# Altium footprint library Chestin_PcbLib.PcbLib: 203 footprints (part 9 of 13)
Each footprint in its own frame and in the unit in brackets; x right, y up, seen from the top. Pads: shape width x height; smd on the part's side, far side on the other; paste and mask are expansions set on the pad; w line width, h text height; cw(c..) or ccw(c..) is an arc to the next point about the centre after c.
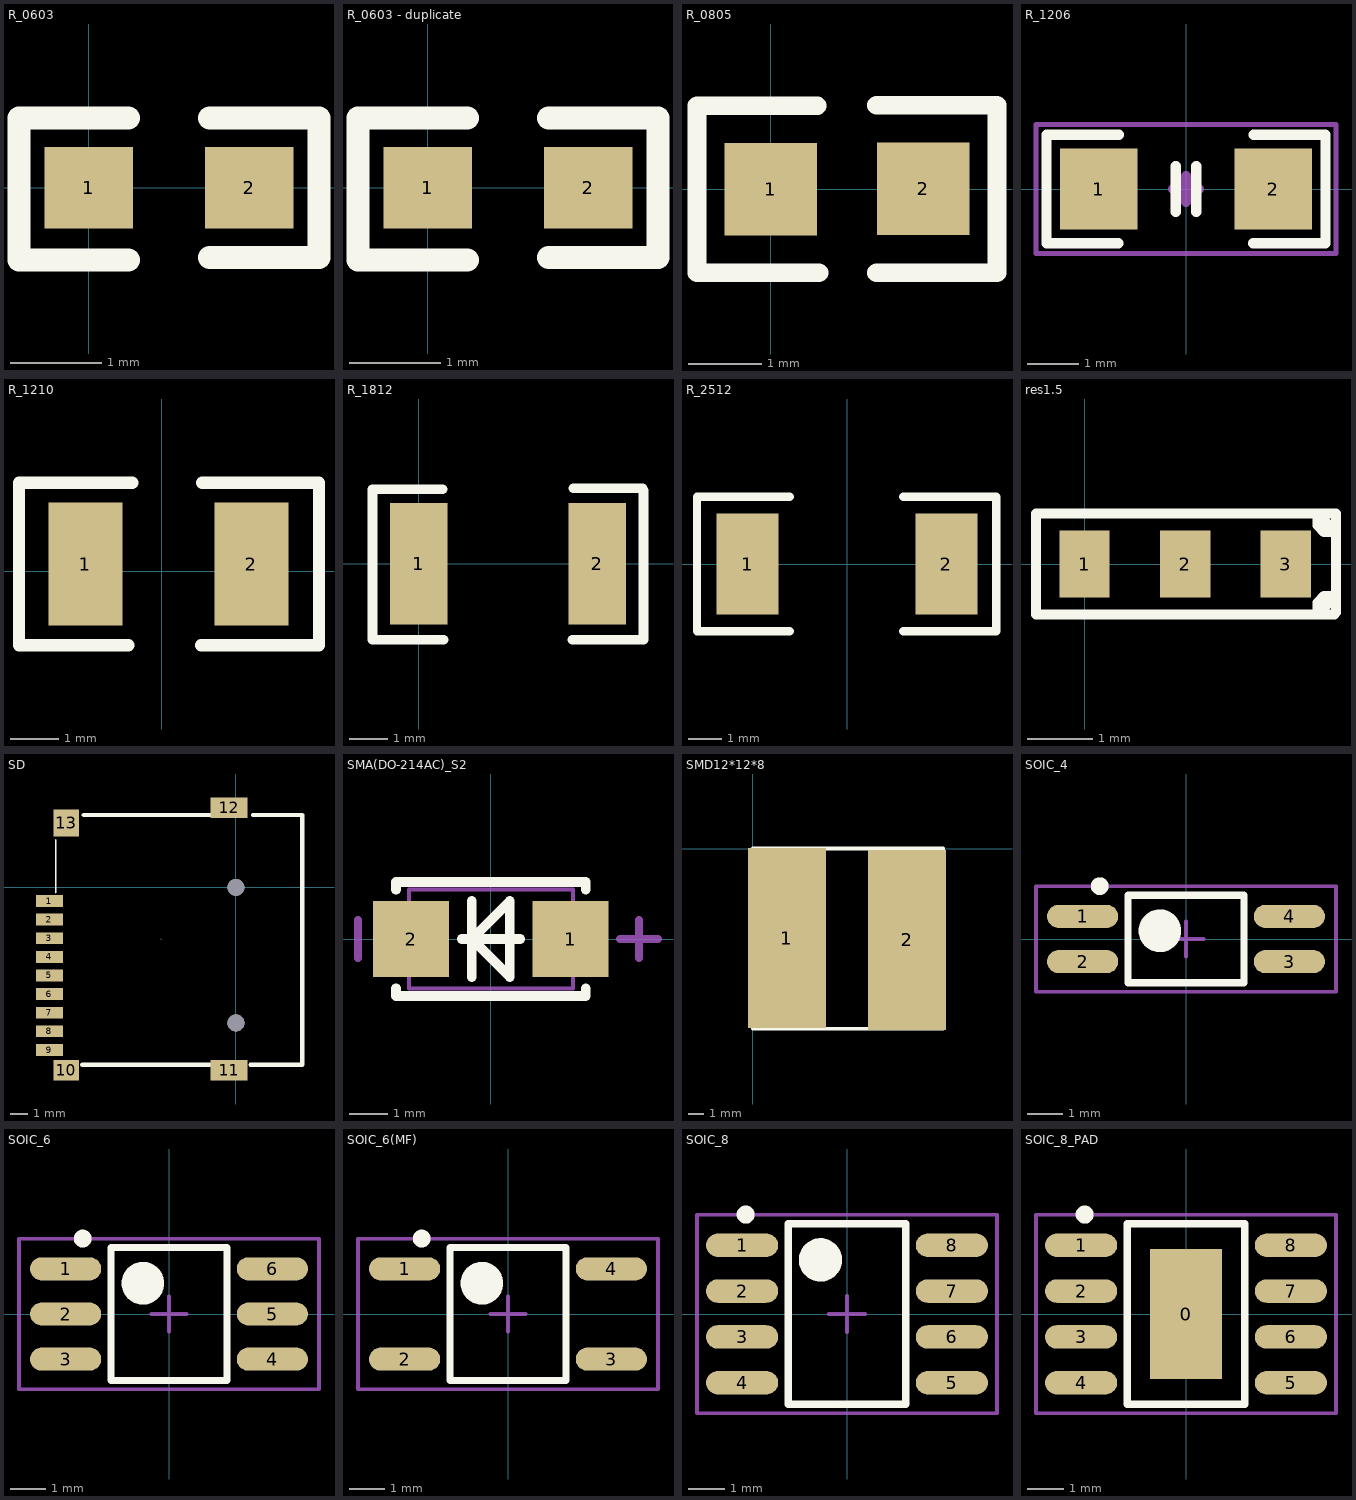
[diagram p8: the footprints below, top view; thin cyan lines are the x and y axes]

## R_0603 [mil] "1608"
pads (2):
  rect 38x35 smd: 1(0,0) 2(69,0)
Top Overlay:
  lines w10: 17,-31 -30,-31 -30,30 17,30 ; 52,-30 99,-30 99,30 52,30
3D body: height 17.72, standoff 0, extent 3.51,-15.74 66.5,15.75

## R_0603 - duplicate [mil] "1608"
pads (2):
  rect 38x35 smd: 1(0,0) 2(69,0)
Top Overlay:
  lines w10: 17,-31 -30,-31 -30,30 17,30 ; 52,-30 99,-30 99,30 52,30
3D body: height 17.72, standoff 0, extent 3.51,-15.74 66.5,15.75

## R_0805 [mm] "2012"
pads (2):
  rect 1.27x1.27 smd: 1(0,0) 2(2.09,0.005)
Top Overlay:
  lines w0.254: 0.635,1.143 -1.011,1.143 -1.011,-1.143 0.66,-1.143 ; 1.448,-1.143 3.099,-1.143 3.099,1.148 1.448,1.148
3D body: height 0.55, standoff 0, extent 0.036,-0.62 2.036,0.64

## R_1206 [mm] "[3216]"
pads (2):
  rect 1.52x1.6 smd: 1(-1.713,0) 2(1.712,0)
Top Overlay:
  lines w0.2: -1.331,-1.067 -2.743,-1.067 -2.743,1.067 -1.323,1.067 ; -0.2,-0.45 -0.2,0.45 ; 0.2,-0.45 0.2,0.45 ; 1.322,-1.067 2.743,-1.067 2.743,1.067 1.331,1.067
Mechanical 15:
  lines w0.1: -2.946,-1.27 2.946,-1.27 2.946,1.27 -2.946,1.27 -2.946,-1.27
  lines w0.2: -0.254,0 0.254,0 ; 0,-0.254 0,0.254
3D body "C_1206.STEP": height 1.21, standoff -0.01, extent -1.6,-0.81 1.6,0.81

## R_1210 [mil] "1/3W"
pads (2):
  rect 60x100 smd: 1(-62,6) 2(73,6)
Top Overlay:
  lines w10: -27,-60 -116,-60 -116,72 -24,72 ; 32,-60 128,-60 128,72 ; 33,72 126.8,72
3D body "1210(3225M) Cap.STEP": height 67.1, standoff 0, extent -72.75,-44 84.75,54

## R_1812 [mil] "4532"
pads (2):
  rect 60x125.98 smd: 1(0,0) 2(185,0)
Top Overlay:
  lines w10: 25,77 -48,77 -48,-78.74 26,-78.74 ; 159,-78.74 233,-78.74 ; 160,78 232,78 ; 233,-78 233,76
3D body "R1808(4520M)1.STEP": height 39.37, standoff 0, extent 2,-39 179.77,37.49

## R_2512 [mil] "6432"
pads (2):
  rect 74x120 smd: 1(-118,0) 2(118,0)
Top Overlay:
  lines w10: -68,-80 -178,-80 -178,80 -68,80 ; 67,-80 177,-80 177,80 67,80
3D body "R2512.STEP": height 39.72, standoff 4.28, extent -125.98,-62.98 125.98,63

## res1.5 [mil]
pads (3):
  rect 30x40 smd: 1(0,0) 2(60,0) 3(120,0)
Top Overlay:
  lines w6: 139,-30 150,-19 ; 139,-30 -29,-30 -29,-5 -29,30 15.75,30 105.25,30 139,30 ; 139,-30 149,-30 150,-29 150,-19 ; 139,-30 139,-23 143,-19 150,-19 ; 139,30 150,19 ; 139,30 150,30 150,19 ; 139,30 139,23 143,19 150,19 ; 150,-19 150,19

## SD [mm]
pads (15):
  rect 1.6x0.7 smd: 1(-11,-0.809) 2(-11,-1.909) 3(-11,-3.005) 4(-11,-4.104) 5(-11,-5.203) 6(-11,-6.301) 7(-11,-7.398) 8(-11,-8.496) 9(-11,-9.6)
  rect 1.5x1.2 smd: 10(-10,-10.8)
  rect 2.2x1.2 smd: 11(-0.4,-10.8) 12(-0.4,4.7)
  rect 1.5x1.6 smd: 13(-10,3.8)
  round 1 hole 1 unplated: ""(0,0) ""(0.003,-8)
Top Overlay:
  lines w0.102: -10.626,-0.314 -10.627,2.785
  lines w0.254: -9.059,-10.467 -1.55,-10.467 ; -8.98,4.265 -1.487,4.265 ; 0.863,-10.467 3.911,-10.467 3.911,4.265 1.013,4.265
Mechanical 15:
  lines w0.003: -4.43,-3.025 -4.379,-3.075

## SMA(DO-214AC)_S2 [mm]
pads (2):
  rect 2x2 smd: 1(2.1,0) 2(-2.1,0)
Top Overlay:
  lines w0.254: -2.5,-1.3 -2.5,-1.5 2.5,-1.5 2.5,-1.3 ; -2.5,1.3 -2.5,1.5 2.5,1.5 2.5,1.3 ; -0.77,0 0.77,0 ; -0.5,-1 -0.5,1 ; -0.5,0 0.5,-1 0.5,1 -0.5,0
Mechanical 13:
  lines w0.1: -2.16,-1.3 2.16,-1.3 2.16,1.3 -2.16,1.3 -2.16,-1.3
Mechanical 15:
  lines w0.203: -3.5,-0.5 -3.5,0.5 ; 3.4,0 4.4,0 ; 3.9,-0.5 3.9,0.5

## SMD12*12*8 [mm]
pads (2):
  rect 5.2x12 smd: 1(2.286,-5.969) 2(10.287,-6.096)
Top Overlay:
  lines w0.254: 0,-12.022 0,0 12.7,0 12.7,-12.022 0.551,-12.022 0,-12.022

## SOIC_4 [mm]
pads (4):
  oval 2x0.65 smd: 1(-2.906,0.635) 2(-2.906,-0.635) 3(2.906,-0.635) 4(2.906,0.635)
Top Overlay:
  circle w0.6: c-0.735,0.23 r0.3
  circle w0.25: c-2.425,1.485 r0.125
  lines w0.2: -1.626,-1.23 1.626,-1.23 1.626,1.23 -1.626,1.23 -1.626,-1.23
Mechanical 15:
  lines w0.1: -0.5,0 0.5,0 ; 0,-0.5 0,0.5 ; -4.216,-1.48 4.216,-1.48 4.216,1.48 -4.216,1.48 -4.216,-1.48
3D body "SOIC_4.STEP": height 1.45, standoff 0, extent -2.981,-1.181 2.981,1.181

## SOIC_6 [mm]
pads (6):
  oval 2x0.65 smd: 1(-2.906,1.27) 2(-2.906,0) 3(-2.906,-1.27) 4(2.906,-1.27) 5(2.906,0) 6(2.906,1.27)
Top Overlay:
  circle w0.6: c-0.735,0.865 r0.3
  circle w0.25: c-2.425,2.12 r0.125
  lines w0.2: -1.626,-1.865 1.626,-1.865 1.626,1.865 -1.626,1.865 -1.626,-1.865
Mechanical 15:
  lines w0.1: -0.5,0 0.5,0 ; 0,-0.5 0,0.5 ; -4.216,-2.115 4.216,-2.115 4.216,2.115 -4.216,2.115 -4.216,-2.115
3D body "SOIC_6.STEP": height 2.78, standoff -0.01, extent -3.199,-1.8 3.199,1.8

## SOIC_6(MF) [mm]
pads (4):
  oval 2x0.65 smd: 1(-2.906,1.27) 2(-2.906,-1.27) 3(2.906,-1.27) 4(2.906,1.27)
Top Overlay:
  circle w0.25: c-2.425,2.12 r0.125
  circle w0.6: c-0.735,0.865 r0.3
  lines w0.2: -1.626,-1.865 -1.626,1.865 1.626,1.865 1.626,-1.865 -1.626,-1.865
Mechanical 15:
  lines w0.1: -0.5,0 0.5,0 ; 0,-0.5 0,0.5 ; -4.216,-2.115 -4.216,2.115 4.216,2.115 4.216,-2.115 -4.216,-2.115
3D body "SOIC_6(MF).STEP": height 2.78, standoff -0.01, extent -3.199,-1.8 3.199,1.8

## SOIC_8 [mm]
height 1.75
pads (8):
  oval 2x0.65 smd: 1(-2.906,1.905) 2(-2.906,0.635) 3(-2.906,-0.635) 4(-2.906,-1.905) 5(2.906,-1.905) 6(2.906,-0.635) 7(2.906,0.635) 8(2.906,1.905)
Top Overlay:
  circle w0.6: c-0.735,1.5 r0.3
  circle w0.25: c-2.806,2.755 r0.125
  lines w0.2: -1.626,-2.5 -1.626,2.5 1.626,2.5 1.626,-2.5 -1.626,-2.5
Mechanical 15:
  lines w0.1: -0.5,0 0.5,0 ; 0,-0.5 0,0.5 ; -4.156,-2.75 4.156,-2.75 4.156,2.75 -4.156,2.75 -4.156,-2.75
3D body "SOIC_8.STEP": height 1.8, standoff 0, extent -2.999,-2.5 2.999,2.5

## SOIC_8_PAD [mm]
height 1.75
pads (9):
  rect 2x3.6 smd: 0(0,0)
  oval 2x0.65 smd: 1(-2.906,1.905) 2(-2.906,0.635) 3(-2.906,-0.635) 4(-2.906,-1.905) 5(2.906,-1.905) 6(2.906,-0.635) 7(2.906,0.635) 8(2.906,1.905)
Top Overlay:
  circle w0.25: c-2.806,2.755 r0.125
  lines w0.2: -1.626,-2.5 -1.626,2.5 1.626,2.5 1.626,-2.5 -1.626,-2.5
Mechanical 15:
  lines w0.1: -0.5,0 0.5,0 ; 0,-0.5 0,0.5 ; -4.156,-2.75 4.156,-2.75 4.156,2.75 -4.156,2.75 -4.156,-2.75
3D body "SOIC_8_PAD.STEP": height 1.8, standoff 0, extent -2.999,-2.5 2.999,2.5